# Altium schematic symbol library Linear Technology PMIC-Switching Reg LTC1174-LTC3901.SchLib: 2647 symbols (part 45 of 195)
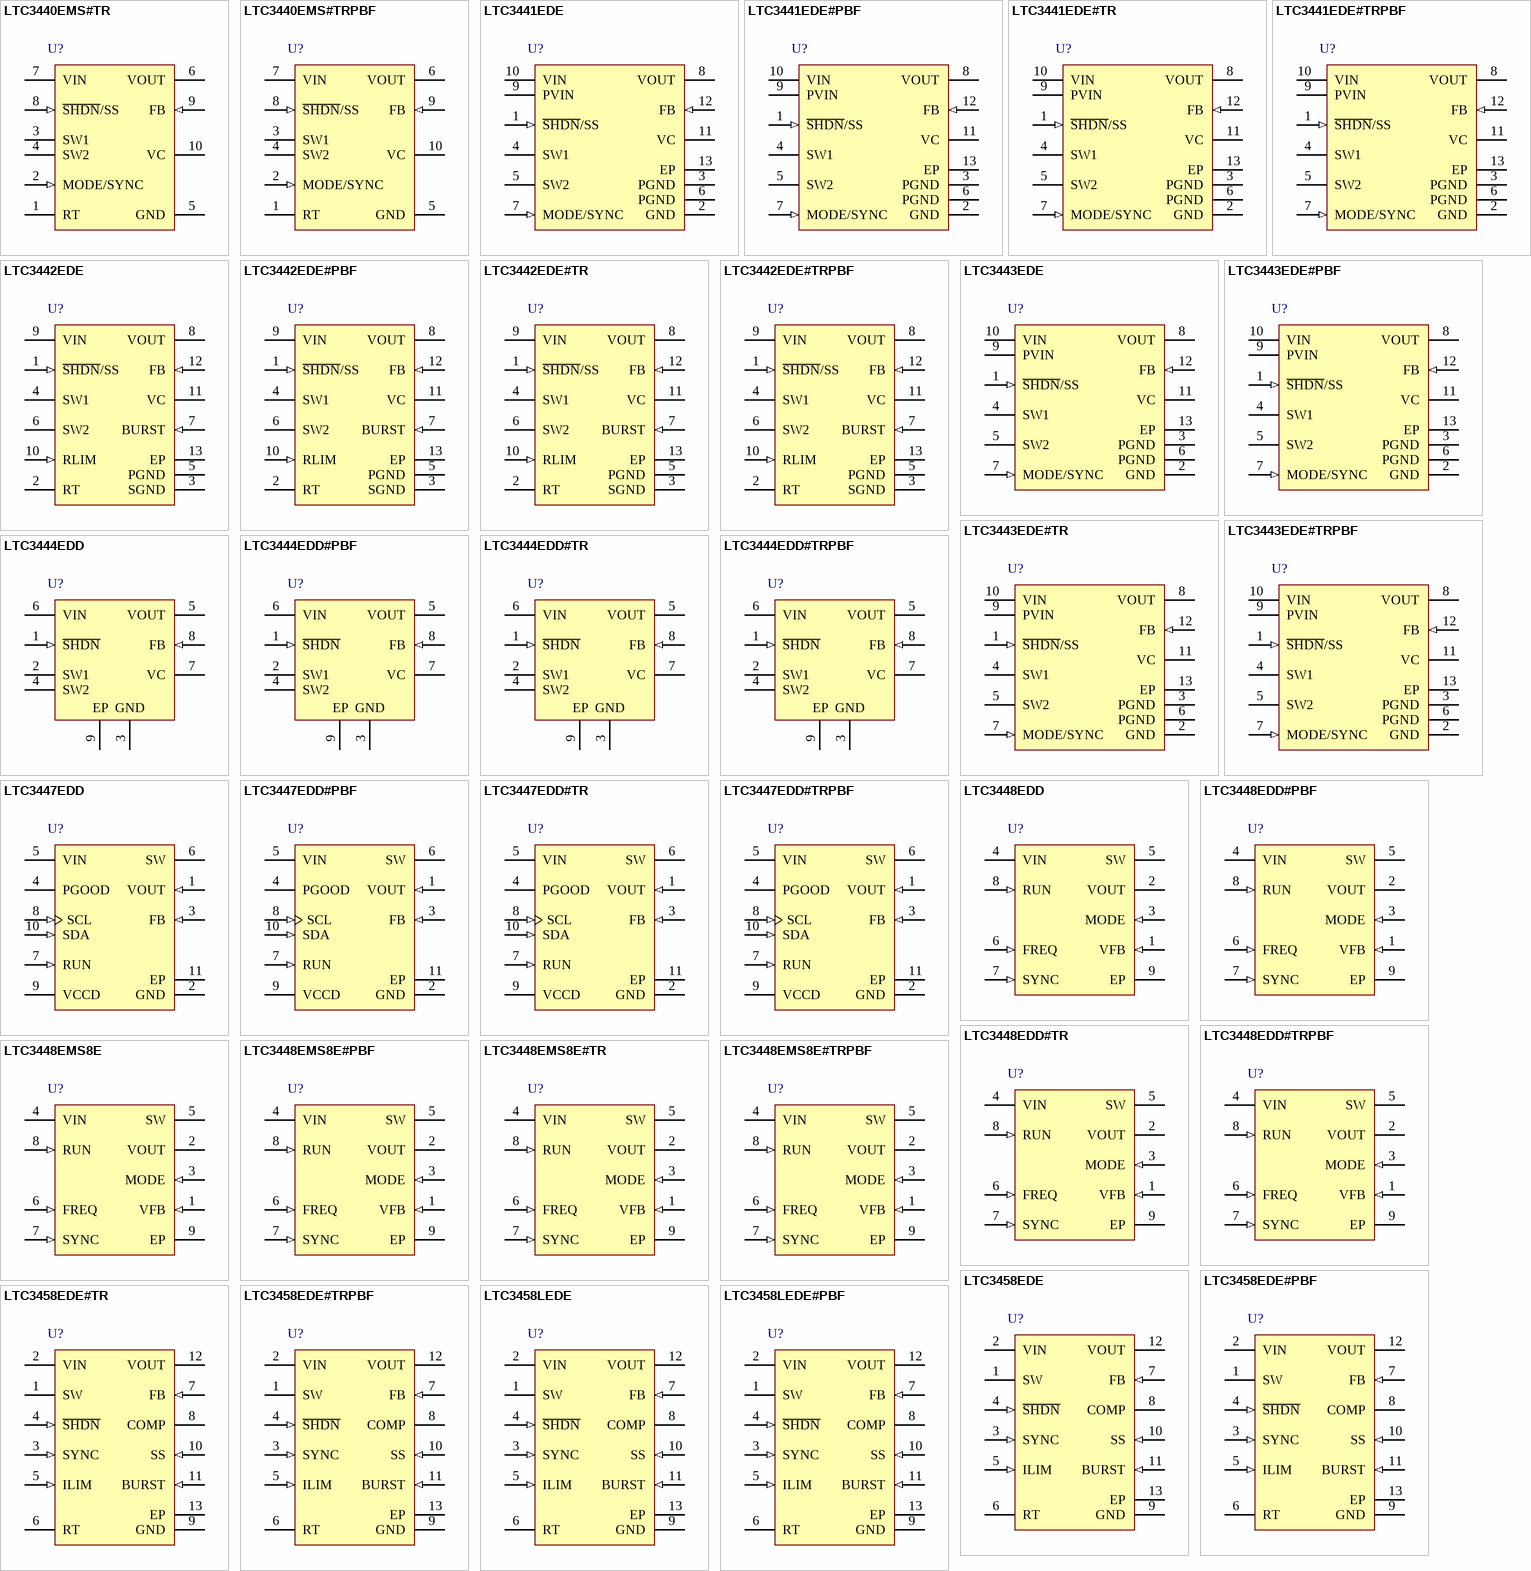
[diagram p160: symbols LTC3440EMS#TR to LTC3458LEDE#PBF]

## LTC3448EDD#PBF
designator U?
1.5 MHz / 2.25 MHz, 600 mA Synchronous Step-Down Regulator with LDO Mode, 8-pin SON (DD-8), -40 to 85 degC, Pb-Free; Manufacturer: Linear Technology; PartNumber: LTC3448EDD#PBF; Number of Outputs: 1; PackageReference: DD-8; PackageDescription: 8-Pin Plastic DFN, Body 3 x 3 mm, Pitch 0.5 mm; Supplier 1: Digi-Key; Supplier Part Number 1: LTC3448EDD#PBF-ND; RoHS: TRUE; Code_JEDEC: MO-229
footprint LT-DD-8_V (SON, 8-Leads, Body 3x3mm, Pitch 0.5mm, Thermal Pad 1.65x2.38 mm)
pins: 1 VFB (in) "Feedback Pin. This pin receives the feedback voltage from an external resistive divider across the output.", 2 VOUT (power) "Output Pin. This pin connects to an external resistor divider and the linear regulator output. Connect externally to the inductor and the output capacitor. The internal linear regulator will supply current up to the (See Datasheet)", 3 MODE (in) "Linear Regulator Control. Grounding this pin turns off the linear regulator. Setting this pin to VIN turns on the linear regulator regardless of the load current. Tying this pin midrange (i.e., to VOUT) will place the linear (See Datasheet)", 4 VIN (power) "Main Supply Pin. This pin must be closely decoupled to GND with a 2.2uF or greater ceramic capacitor.", 5 SW (power) "Switch Node Connection to Inductor. This pin connects to the drains of the internal main and synchronous power MOSFET switches.", 6 FREQ (in) "Frequency Select. Switching frequency is set to 1.5MHz when FREQ = 0V and to 2.25MHz when FREQ = VIN. Do not float this pin.", 7 SYNC (in) "External Synchronization Pin. The oscillation frequency can be synchronized to an external oscillator applied to this pin. For external frequencies above 2.2MHz, pull FREQ high.", 8 RUN (in) "Run Control Input. Forcing this pin above 1.5V enables the part. Forcing this pin below 0.3V shuts down the device. In shutdown, all functions are disabled drawing <1uA supply current. Do not leave RUN floating.", 9 EP (power) "Ground. This pin must be soldered to PCB."

## LTC3448EDD#TR
designator U?
1.5 MHz / 2.25 MHz, 600 mA Synchronous Step-Down Regulator with LDO Mode, 8-pin SON (DD-8), -40 to 85 degC, Tape and Reel; Manufacturer: Linear Technology; PartNumber: LTC3448EDD#TR; Number of Outputs: 1; PackageReference: DD-8; PackageDescription: 8-Pin Plastic DFN, Body 3 x 3 mm, Pitch 0.5 mm; RoHS: FALSE; Code_JEDEC: MO-229
footprint LT-DD-8_V (SON, 8-Leads, Body 3x3mm, Pitch 0.5mm, Thermal Pad 1.65x2.38 mm)
pins: 1 VFB (in) "Feedback Pin. This pin receives the feedback voltage from an external resistive divider across the output.", 2 VOUT (power) "Output Pin. This pin connects to an external resistor divider and the linear regulator output. Connect externally to the inductor and the output capacitor. The internal linear regulator will supply current up to the (See Datasheet)", 3 MODE (in) "Linear Regulator Control. Grounding this pin turns off the linear regulator. Setting this pin to VIN turns on the linear regulator regardless of the load current. Tying this pin midrange (i.e., to VOUT) will place the linear (See Datasheet)", 4 VIN (power) "Main Supply Pin. This pin must be closely decoupled to GND with a 2.2uF or greater ceramic capacitor.", 5 SW (power) "Switch Node Connection to Inductor. This pin connects to the drains of the internal main and synchronous power MOSFET switches.", 6 FREQ (in) "Frequency Select. Switching frequency is set to 1.5MHz when FREQ = 0V and to 2.25MHz when FREQ = VIN. Do not float this pin.", 7 SYNC (in) "External Synchronization Pin. The oscillation frequency can be synchronized to an external oscillator applied to this pin. For external frequencies above 2.2MHz, pull FREQ high.", 8 RUN (in) "Run Control Input. Forcing this pin above 1.5V enables the part. Forcing this pin below 0.3V shuts down the device. In shutdown, all functions are disabled drawing <1uA supply current. Do not leave RUN floating.", 9 EP (power) "Ground. This pin must be soldered to PCB."

## LTC3448EDD#TRPBF
designator U?
1.5 MHz / 2.25 MHz, 600 mA Synchronous Step-Down Regulator with LDO Mode, 8-pin SON (DD-8), -40 to 85 degC, Pb-Free, Tape and Reel; Manufacturer: Linear Technology; PartNumber: LTC3448EDD#TRPBF; Number of Outputs: 1; PackageReference: DD-8; PackageDescription: 8-Pin Plastic DFN, Body 3 x 3 mm, Pitch 0.5 mm; Supplier 1: Digi-Key; Supplier Part Number 1: LTC3448EDD#TRPBF-ND; RoHS: TRUE; Code_JEDEC: MO-229
footprint LT-DD-8_V (SON, 8-Leads, Body 3x3mm, Pitch 0.5mm, Thermal Pad 1.65x2.38 mm)
pins: 1 VFB (in) "Feedback Pin. This pin receives the feedback voltage from an external resistive divider across the output.", 2 VOUT (power) "Output Pin. This pin connects to an external resistor divider and the linear regulator output. Connect externally to the inductor and the output capacitor. The internal linear regulator will supply current up to the (See Datasheet)", 3 MODE (in) "Linear Regulator Control. Grounding this pin turns off the linear regulator. Setting this pin to VIN turns on the linear regulator regardless of the load current. Tying this pin midrange (i.e., to VOUT) will place the linear (See Datasheet)", 4 VIN (power) "Main Supply Pin. This pin must be closely decoupled to GND with a 2.2uF or greater ceramic capacitor.", 5 SW (power) "Switch Node Connection to Inductor. This pin connects to the drains of the internal main and synchronous power MOSFET switches.", 6 FREQ (in) "Frequency Select. Switching frequency is set to 1.5MHz when FREQ = 0V and to 2.25MHz when FREQ = VIN. Do not float this pin.", 7 SYNC (in) "External Synchronization Pin. The oscillation frequency can be synchronized to an external oscillator applied to this pin. For external frequencies above 2.2MHz, pull FREQ high.", 8 RUN (in) "Run Control Input. Forcing this pin above 1.5V enables the part. Forcing this pin below 0.3V shuts down the device. In shutdown, all functions are disabled drawing <1uA supply current. Do not leave RUN floating.", 9 EP (power) "Ground. This pin must be soldered to PCB."

## LTC3448EMS8E
designator U?
1.5 MHz / 2.25 MHz, 600 mA Synchronous Step-Down Regulator with LDO Mode, 8-pin SOP (MS8E-8), -40 to 85 degC; Manufacturer: Linear Technology; PartNumber: LTC3448EMS8E; Number of Outputs: 1; PackageReference: MS8E-8; PackageDescription: 8-Pin Plastic MSOP, Exposed Die Pad, Body 3 x 3 mm, Pitch 0.65 mm; Supplier 1: Digi-Key; Supplier Part Number 1: LTC3448EMS8E-ND; RoHS: FALSE
footprint LT-MS8E-8-2060X1830TP_N (SOP, 8-Leads, Body 3.1x3.1mm, Pitch 0.65mm, Thermal Pad 2.162x1.932mm, IPC Medium Density)
footprint LT-MS8E-8-2060X1830TP_L (SOP, 8-Leads, Body 3.1x3.1mm, Pitch 0.65mm, Thermal Pad 2.162x1.932mm, IPC High Density)
footprint LT-MS8E-8-2060X1830TP_M (SOP, 8-Leads, Body 3.1x3.1mm, Pitch 0.65mm, Thermal Pad 2.162x1.932mm, IPC Low Density)
pins: 1 VFB (in) "Feedback Pin. This pin receives the feedback voltage from an external resistive divider across the output.", 2 VOUT (power) "Output Pin. This pin connects to an external resistor divider and the linear regulator output. Connect externally to the inductor and the output capacitor. The internal linear regulator will supply current up to the (See Datasheet)", 3 MODE (in) "Linear Regulator Control. Grounding this pin turns off the linear regulator. Setting this pin to VIN turns on the linear regulator regardless of the load current. Tying this pin midrange (i.e., to VOUT) will place the linear (See Datasheet)", 4 VIN (power) "Main Supply Pin. This pin must be closely decoupled to GND with a 2.2uF or greater ceramic capacitor.", 5 SW (power) "Switch Node Connection to Inductor. This pin connects to the drains of the internal main and synchronous power MOSFET switches.", 6 FREQ (in) "Frequency Select. Switching frequency is set to 1.5MHz when FREQ = 0V and to 2.25MHz when FREQ = VIN. Do not float this pin.", 7 SYNC (in) "External Synchronization Pin. The oscillation frequency can be synchronized to an external oscillator applied to this pin. For external frequencies above 2.2MHz, pull FREQ high.", 8 RUN (in) "Run Control Input. Forcing this pin above 1.5V enables the part. Forcing this pin below 0.3V shuts down the device. In shutdown, all functions are disabled drawing <1uA supply current. Do not leave RUN floating.", 9 EP (power) "Ground. This pin must be soldered to PCB."

## LTC3448EMS8E#PBF
designator U?
1.5 MHz / 2.25 MHz, 600 mA Synchronous Step-Down Regulator with LDO Mode, 8-pin SOP (MS8E-8), -40 to 85 degC, Pb-Free; Manufacturer: Linear Technology; PartNumber: LTC3448EMS8E#PBF; Number of Outputs: 1; PackageReference: MS8E-8; PackageDescription: 8-Pin Plastic MSOP, Exposed Die Pad, Body 3 x 3 mm, Pitch 0.65 mm; Supplier 1: Digi-Key; Supplier Part Number 1: LTC3448EMS8E#PBF-ND; RoHS: TRUE
footprint LT-MS8E-8-2060X1830TP_N (SOP, 8-Leads, Body 3.1x3.1mm, Pitch 0.65mm, Thermal Pad 2.162x1.932mm, IPC Medium Density)
footprint LT-MS8E-8-2060X1830TP_L (SOP, 8-Leads, Body 3.1x3.1mm, Pitch 0.65mm, Thermal Pad 2.162x1.932mm, IPC High Density)
footprint LT-MS8E-8-2060X1830TP_M (SOP, 8-Leads, Body 3.1x3.1mm, Pitch 0.65mm, Thermal Pad 2.162x1.932mm, IPC Low Density)
pins: 1 VFB (in) "Feedback Pin. This pin receives the feedback voltage from an external resistive divider across the output.", 2 VOUT (power) "Output Pin. This pin connects to an external resistor divider and the linear regulator output. Connect externally to the inductor and the output capacitor. The internal linear regulator will supply current up to the (See Datasheet)", 3 MODE (in) "Linear Regulator Control. Grounding this pin turns off the linear regulator. Setting this pin to VIN turns on the linear regulator regardless of the load current. Tying this pin midrange (i.e., to VOUT) will place the linear (See Datasheet)", 4 VIN (power) "Main Supply Pin. This pin must be closely decoupled to GND with a 2.2uF or greater ceramic capacitor.", 5 SW (power) "Switch Node Connection to Inductor. This pin connects to the drains of the internal main and synchronous power MOSFET switches.", 6 FREQ (in) "Frequency Select. Switching frequency is set to 1.5MHz when FREQ = 0V and to 2.25MHz when FREQ = VIN. Do not float this pin.", 7 SYNC (in) "External Synchronization Pin. The oscillation frequency can be synchronized to an external oscillator applied to this pin. For external frequencies above 2.2MHz, pull FREQ high.", 8 RUN (in) "Run Control Input. Forcing this pin above 1.5V enables the part. Forcing this pin below 0.3V shuts down the device. In shutdown, all functions are disabled drawing <1uA supply current. Do not leave RUN floating.", 9 EP (power) "Ground. This pin must be soldered to PCB."

## LTC3448EMS8E#TR
designator U?
1.5 MHz / 2.25 MHz, 600 mA Synchronous Step-Down Regulator with LDO Mode, 8-pin SOP (MS8E-8), -40 to 85 degC, Tape and Reel; Manufacturer: Linear Technology; PartNumber: LTC3448EMS8E#TR; Number of Outputs: 1; PackageReference: MS8E-8; PackageDescription: 8-Pin Plastic MSOP, Exposed Die Pad, Body 3 x 3 mm, Pitch 0.65 mm; RoHS: FALSE
footprint LT-MS8E-8-2060X1830TP_N (SOP, 8-Leads, Body 3.1x3.1mm, Pitch 0.65mm, Thermal Pad 2.162x1.932mm, IPC Medium Density)
footprint LT-MS8E-8-2060X1830TP_L (SOP, 8-Leads, Body 3.1x3.1mm, Pitch 0.65mm, Thermal Pad 2.162x1.932mm, IPC High Density)
footprint LT-MS8E-8-2060X1830TP_M (SOP, 8-Leads, Body 3.1x3.1mm, Pitch 0.65mm, Thermal Pad 2.162x1.932mm, IPC Low Density)
pins: 1 VFB (in) "Feedback Pin. This pin receives the feedback voltage from an external resistive divider across the output.", 2 VOUT (power) "Output Pin. This pin connects to an external resistor divider and the linear regulator output. Connect externally to the inductor and the output capacitor. The internal linear regulator will supply current up to the (See Datasheet)", 3 MODE (in) "Linear Regulator Control. Grounding this pin turns off the linear regulator. Setting this pin to VIN turns on the linear regulator regardless of the load current. Tying this pin midrange (i.e., to VOUT) will place the linear (See Datasheet)", 4 VIN (power) "Main Supply Pin. This pin must be closely decoupled to GND with a 2.2uF or greater ceramic capacitor.", 5 SW (power) "Switch Node Connection to Inductor. This pin connects to the drains of the internal main and synchronous power MOSFET switches.", 6 FREQ (in) "Frequency Select. Switching frequency is set to 1.5MHz when FREQ = 0V and to 2.25MHz when FREQ = VIN. Do not float this pin.", 7 SYNC (in) "External Synchronization Pin. The oscillation frequency can be synchronized to an external oscillator applied to this pin. For external frequencies above 2.2MHz, pull FREQ high.", 8 RUN (in) "Run Control Input. Forcing this pin above 1.5V enables the part. Forcing this pin below 0.3V shuts down the device. In shutdown, all functions are disabled drawing <1uA supply current. Do not leave RUN floating.", 9 EP (power) "Ground. This pin must be soldered to PCB."

## LTC3448EMS8E#TRPBF
designator U?
1.5 MHz / 2.25 MHz, 600 mA Synchronous Step-Down Regulator with LDO Mode, 8-pin SOP (MS8E-8), -40 to 85 degC, Pb-Free, Tape and Reel; Manufacturer: Linear Technology; PartNumber: LTC3448EMS8E#TRPBF; Number of Outputs: 1; PackageReference: MS8E-8; PackageDescription: 8-Pin Plastic MSOP, Exposed Die Pad, Body 3 x 3 mm, Pitch 0.65 mm; Supplier 1: Digi-Key; Supplier Part Number 1: LTC3448EMS8E#TRPBF-ND; RoHS: TRUE
footprint LT-MS8E-8-2060X1830TP_N (SOP, 8-Leads, Body 3.1x3.1mm, Pitch 0.65mm, Thermal Pad 2.162x1.932mm, IPC Medium Density)
footprint LT-MS8E-8-2060X1830TP_L (SOP, 8-Leads, Body 3.1x3.1mm, Pitch 0.65mm, Thermal Pad 2.162x1.932mm, IPC High Density)
footprint LT-MS8E-8-2060X1830TP_M (SOP, 8-Leads, Body 3.1x3.1mm, Pitch 0.65mm, Thermal Pad 2.162x1.932mm, IPC Low Density)
pins: 1 VFB (in) "Feedback Pin. This pin receives the feedback voltage from an external resistive divider across the output.", 2 VOUT (power) "Output Pin. This pin connects to an external resistor divider and the linear regulator output. Connect externally to the inductor and the output capacitor. The internal linear regulator will supply current up to the (See Datasheet)", 3 MODE (in) "Linear Regulator Control. Grounding this pin turns off the linear regulator. Setting this pin to VIN turns on the linear regulator regardless of the load current. Tying this pin midrange (i.e., to VOUT) will place the linear (See Datasheet)", 4 VIN (power) "Main Supply Pin. This pin must be closely decoupled to GND with a 2.2uF or greater ceramic capacitor.", 5 SW (power) "Switch Node Connection to Inductor. This pin connects to the drains of the internal main and synchronous power MOSFET switches.", 6 FREQ (in) "Frequency Select. Switching frequency is set to 1.5MHz when FREQ = 0V and to 2.25MHz when FREQ = VIN. Do not float this pin.", 7 SYNC (in) "External Synchronization Pin. The oscillation frequency can be synchronized to an external oscillator applied to this pin. For external frequencies above 2.2MHz, pull FREQ high.", 8 RUN (in) "Run Control Input. Forcing this pin above 1.5V enables the part. Forcing this pin below 0.3V shuts down the device. In shutdown, all functions are disabled drawing <1uA supply current. Do not leave RUN floating.", 9 EP (power) "Ground. This pin must be soldered to PCB."

## LTC3458EDE
designator U?
1.4 A, 1.5 MHz Synchronous Step-Up DC/DC Converter with Output Disconnect, 12-pin SON (DE-UE-12), -40 to 85 degC; Manufacturer: Linear Technology; PartNumber: LTC3458EDE; Number of Outputs: 1; PackageReference: DE-UE-12; PackageDescription: 12-Pin Plastic DFN, Body 4 x 3 mm, Pitch 0.5 mm; Supplier 1: Digi-Key; Supplier Part Number 1: LTC3458EDE-ND; RoHS: FALSE; Code_JEDEC: MO-229
footprint LT-DE-UE-12_V (SON, 12-Leads, Body 4x3mm, Pitch 0.5mm, Thermal Pad 3.3x1.7mm)
pins: 1 SW "Switch Pin for Inductor Connection. During discontinuous conduction mode an antiring resistor connects SW to VIN to reduce noise.", 2 VIN (power) "Input Supply Pin. Connect this to the input supply and decouple with 1uF minimum.", 3 SYNC (in) "Oscillator Synchronization Pin. A clock pulse width of 100ns to 2us is required to synchronize the internal oscillator. This pin is disabled when grounded.", 4 ~{SHDN} (in) "Shutdown Pin. Grounding this pin shuts down the IC. Connect to >1.25V to enable.", 5 ILIM (in) "Adjustable Peak Current Limit. Connect a resistor from ILIM to GND to program the peak inductor current according to the following formula: ILIMIT=180/RILIM where ILIMIT is in amps and RILIM is in kohm.", 6 RT "Connect a resistor to ground to program the oscillator frequency, according to the formula:  Fosc = 1/(0.2+0.004 ?RT) where fOSC is in MHz and RT is in kohm. Oscillator frequency can be programmed between 400kHz and (See Datasheet)", 7 FB (in) "Connect Resistor Divider Tap Here. The output voltage can be adjusted from 2V to 6V. Feedback reference voltage is typically 1.225V.", 8 COMP "gm Error Amp Output. A frequency compensation network is connected from this pin to ground to compensate the loop. See the section “Compensating the Feedback Loop?for guidelines.", 9 GND (power) "Signal Ground Pin.", 10 SS (in) "Connect a capacitor between this pin and ground to set soft-start period. 5uA of current is sourced from SS during soft-start.", 11 BURST (in) "Burst Mode Threshold Adjust Pin. A resistor/capacitor combination from this pin to ground programs the average load current at which automatic Burst Mode operation is entered.", 12 VOUT (power) "Output of the Synchronous Rectifier and Internal Gate Drive Source for the Power Switches.", 13 EP (power) "Must be soldered to PCB ground, for electrical contact and optimum thermal performance."

## LTC3458EDE#PBF
designator U?
1.4 A, 1.5 MHz Synchronous Step-Up DC/DC Converter with Output Disconnect, 12-pin SON (DE-UE-12), -40 to 85 degC, Pb-Free; Manufacturer: Linear Technology; PartNumber: LTC3458EDE#PBF; Number of Outputs: 1; PackageReference: DE-UE-12; PackageDescription: 12-Pin Plastic DFN, Body 4 x 3 mm, Pitch 0.5 mm; Supplier 1: Digi-Key; Supplier Part Number 1: LTC3458EDE#PBF-ND; RoHS: TRUE; Code_JEDEC: MO-229
footprint LT-DE-UE-12_V (SON, 12-Leads, Body 4x3mm, Pitch 0.5mm, Thermal Pad 3.3x1.7mm)
pins: 1 SW "Switch Pin for Inductor Connection. During discontinuous conduction mode an antiring resistor connects SW to VIN to reduce noise.", 2 VIN (power) "Input Supply Pin. Connect this to the input supply and decouple with 1uF minimum.", 3 SYNC (in) "Oscillator Synchronization Pin. A clock pulse width of 100ns to 2us is required to synchronize the internal oscillator. This pin is disabled when grounded.", 4 ~{SHDN} (in) "Shutdown Pin. Grounding this pin shuts down the IC. Connect to >1.25V to enable.", 5 ILIM (in) "Adjustable Peak Current Limit. Connect a resistor from ILIM to GND to program the peak inductor current according to the following formula: ILIMIT=180/RILIM where ILIMIT is in amps and RILIM is in kohm.", 6 RT "Connect a resistor to ground to program the oscillator frequency, according to the formula:  Fosc = 1/(0.2+0.004 ?RT) where fOSC is in MHz and RT is in kohm. Oscillator frequency can be programmed between 400kHz and (See Datasheet)", 7 FB (in) "Connect Resistor Divider Tap Here. The output voltage can be adjusted from 2V to 6V. Feedback reference voltage is typically 1.225V.", 8 COMP "gm Error Amp Output. A frequency compensation network is connected from this pin to ground to compensate the loop. See the section “Compensating the Feedback Loop?for guidelines.", 9 GND (power) "Signal Ground Pin.", 10 SS (in) "Connect a capacitor between this pin and ground to set soft-start period. 5uA of current is sourced from SS during soft-start.", 11 BURST (in) "Burst Mode Threshold Adjust Pin. A resistor/capacitor combination from this pin to ground programs the average load current at which automatic Burst Mode operation is entered.", 12 VOUT (power) "Output of the Synchronous Rectifier and Internal Gate Drive Source for the Power Switches.", 13 EP (power) "Must be soldered to PCB ground, for electrical contact and optimum thermal performance."

## LTC3458EDE#TR
designator U?
1.4 A, 1.5 MHz Synchronous Step-Up DC/DC Converter with Output Disconnect, 12-pin SON (DE-UE-12), -40 to 85 degC, Tape and Reel; Manufacturer: Linear Technology; PartNumber: LTC3458EDE#TR; Number of Outputs: 1; PackageReference: DE-UE-12; PackageDescription: 12-Pin Plastic DFN, Body 4 x 3 mm, Pitch 0.5 mm; RoHS: FALSE; Code_JEDEC: MO-229
footprint LT-DE-UE-12_V (SON, 12-Leads, Body 4x3mm, Pitch 0.5mm, Thermal Pad 3.3x1.7mm)
pins: 1 SW "Switch Pin for Inductor Connection. During discontinuous conduction mode an antiring resistor connects SW to VIN to reduce noise.", 2 VIN (power) "Input Supply Pin. Connect this to the input supply and decouple with 1uF minimum.", 3 SYNC (in) "Oscillator Synchronization Pin. A clock pulse width of 100ns to 2us is required to synchronize the internal oscillator. This pin is disabled when grounded.", 4 ~{SHDN} (in) "Shutdown Pin. Grounding this pin shuts down the IC. Connect to >1.25V to enable.", 5 ILIM (in) "Adjustable Peak Current Limit. Connect a resistor from ILIM to GND to program the peak inductor current according to the following formula: ILIMIT=180/RILIM where ILIMIT is in amps and RILIM is in kohm.", 6 RT "Connect a resistor to ground to program the oscillator frequency, according to the formula:  Fosc = 1/(0.2+0.004 ?RT) where fOSC is in MHz and RT is in kohm. Oscillator frequency can be programmed between 400kHz and (See Datasheet)", 7 FB (in) "Connect Resistor Divider Tap Here. The output voltage can be adjusted from 2V to 6V. Feedback reference voltage is typically 1.225V.", 8 COMP "gm Error Amp Output. A frequency compensation network is connected from this pin to ground to compensate the loop. See the section “Compensating the Feedback Loop?for guidelines.", 9 GND (power) "Signal Ground Pin.", 10 SS (in) "Connect a capacitor between this pin and ground to set soft-start period. 5uA of current is sourced from SS during soft-start.", 11 BURST (in) "Burst Mode Threshold Adjust Pin. A resistor/capacitor combination from this pin to ground programs the average load current at which automatic Burst Mode operation is entered.", 12 VOUT (power) "Output of the Synchronous Rectifier and Internal Gate Drive Source for the Power Switches.", 13 EP (power) "Must be soldered to PCB ground, for electrical contact and optimum thermal performance."

## LTC3458EDE#TRPBF
designator U?
1.4 A, 1.5 MHz Synchronous Step-Up DC/DC Converter with Output Disconnect, 12-pin SON (DE-UE-12), -40 to 85 degC, Pb-Free, Tape and Reel; Manufacturer: Linear Technology; PartNumber: LTC3458EDE#TRPBF; Number of Outputs: 1; PackageReference: DE-UE-12; PackageDescription: 12-Pin Plastic DFN, Body 4 x 3 mm, Pitch 0.5 mm; Supplier 1: Digi-Key; Supplier Part Number 1: LTC3458EDE#TRPBF-ND; RoHS: TRUE; Code_JEDEC: MO-229
footprint LT-DE-UE-12_V (SON, 12-Leads, Body 4x3mm, Pitch 0.5mm, Thermal Pad 3.3x1.7mm)
pins: 1 SW "Switch Pin for Inductor Connection. During discontinuous conduction mode an antiring resistor connects SW to VIN to reduce noise.", 2 VIN (power) "Input Supply Pin. Connect this to the input supply and decouple with 1uF minimum.", 3 SYNC (in) "Oscillator Synchronization Pin. A clock pulse width of 100ns to 2us is required to synchronize the internal oscillator. This pin is disabled when grounded.", 4 ~{SHDN} (in) "Shutdown Pin. Grounding this pin shuts down the IC. Connect to >1.25V to enable.", 5 ILIM (in) "Adjustable Peak Current Limit. Connect a resistor from ILIM to GND to program the peak inductor current according to the following formula: ILIMIT=180/RILIM where ILIMIT is in amps and RILIM is in kohm.", 6 RT "Connect a resistor to ground to program the oscillator frequency, according to the formula:  Fosc = 1/(0.2+0.004 ?RT) where fOSC is in MHz and RT is in kohm. Oscillator frequency can be programmed between 400kHz and (See Datasheet)", 7 FB (in) "Connect Resistor Divider Tap Here. The output voltage can be adjusted from 2V to 6V. Feedback reference voltage is typically 1.225V.", 8 COMP "gm Error Amp Output. A frequency compensation network is connected from this pin to ground to compensate the loop. See the section “Compensating the Feedback Loop?for guidelines.", 9 GND (power) "Signal Ground Pin.", 10 SS (in) "Connect a capacitor between this pin and ground to set soft-start period. 5uA of current is sourced from SS during soft-start.", 11 BURST (in) "Burst Mode Threshold Adjust Pin. A resistor/capacitor combination from this pin to ground programs the average load current at which automatic Burst Mode operation is entered.", 12 VOUT (power) "Output of the Synchronous Rectifier and Internal Gate Drive Source for the Power Switches.", 13 EP (power) "Must be soldered to PCB ground, for electrical contact and optimum thermal performance."

## LTC3458LEDE
designator U?
1.7 A, 1.5 MHz Synchronous Step-Up DC/DC Converter with Output Disconnect, 12-pin SON (DE-UE-12), -40 to 85 degC; Manufacturer: Linear Technology; PartNumber: LTC3458LEDE; Number of Outputs: 1; PackageReference: DE-UE-12; PackageDescription: 12-Pin Plastic DFN, Body 4 x 3 mm, Pitch 0.5 mm; Supplier 1: Digi-Key; Supplier Part Number 1: LTC3458LEDE-ND; RoHS: FALSE; Code_JEDEC: MO-229
footprint LT-DE-UE-12_V (SON, 12-Leads, Body 4x3mm, Pitch 0.5mm, Thermal Pad 3.3x1.7mm)
pins: 1 SW (power) "Switch Pin for Inductor Connection. During discontinuous conduction mode an antiring resistor connects SW to VIN to reduce noise.", 2 VIN (power) "Input Supply Pin. Connect this to the input supply and decouple with 1uF minimum.", 3 SYNC (in) "Oscillator Synchronization Pin. A clock pulse width of 100ns to 2us is required to synchronize the internal oscillator. This pin is disabled when grounded.", 4 ~{SHDN} (in) "Shutdown Pin. Grounding this pin shuts down the IC. Connect to >1.25V to enable.", 5 ILIM (in) "Adjustable Peak Current Limit. Connect a resistor from ILIM to GND to program the peak inductor current according to the following formula: ILIMIT=180/RILIM where ILIMIT is in amps and RILIM is in kohm.", 6 RT "Connect a resistor to ground to program the oscillator frequency, according to the formula:  Fosc = 1/(0.2+0.004 ?RT) where fOSC is in MHz and RT is in kohm. Oscillator frequency can be programmed between 400kHz and (See Datasheet)", 7 FB (in) "Connect Resistor Divider Tap Here. The output voltage can be adjusted from 2V to 6V. Feedback reference voltage is typically 1.225V.", 8 COMP "gm Error Amp Output. A frequency compensation network is connected from this pin to ground to compensate the loop. See the section “Compensating the Feedback Loop?for guidelines.", 9 GND (power) "Signal Ground Pin.", 10 SS (in) "Connect a capacitor between this pin and ground to set soft-start period. 5uA of current is sourced from SS during soft-start.", 11 BURST (in) "Burst Mode Threshold Adjust Pin. A resistor/capacitor combination from this pin to ground programs the average load current at which automatic Burst Mode operation is entered.", 12 VOUT (power) "Output of the Synchronous Rectifier and Internal Gate Drive Source for the Power Switches.", 13 EP (power) "Must be soldered to PCB ground, for electrical contact and optimum thermal performance."